# Altium footprint library Footprints.PcbLib: 266 footprints (part 1 of 17)
Each footprint in its own frame and in the unit in brackets; x right, y up, seen from the top. Pads: shape width x height; smd on the part's side, far side on the other; paste and mask are expansions set on the pad; w line width, h text height; cw(c..) or ccw(c..) is an arc to the next point about the centre after c.
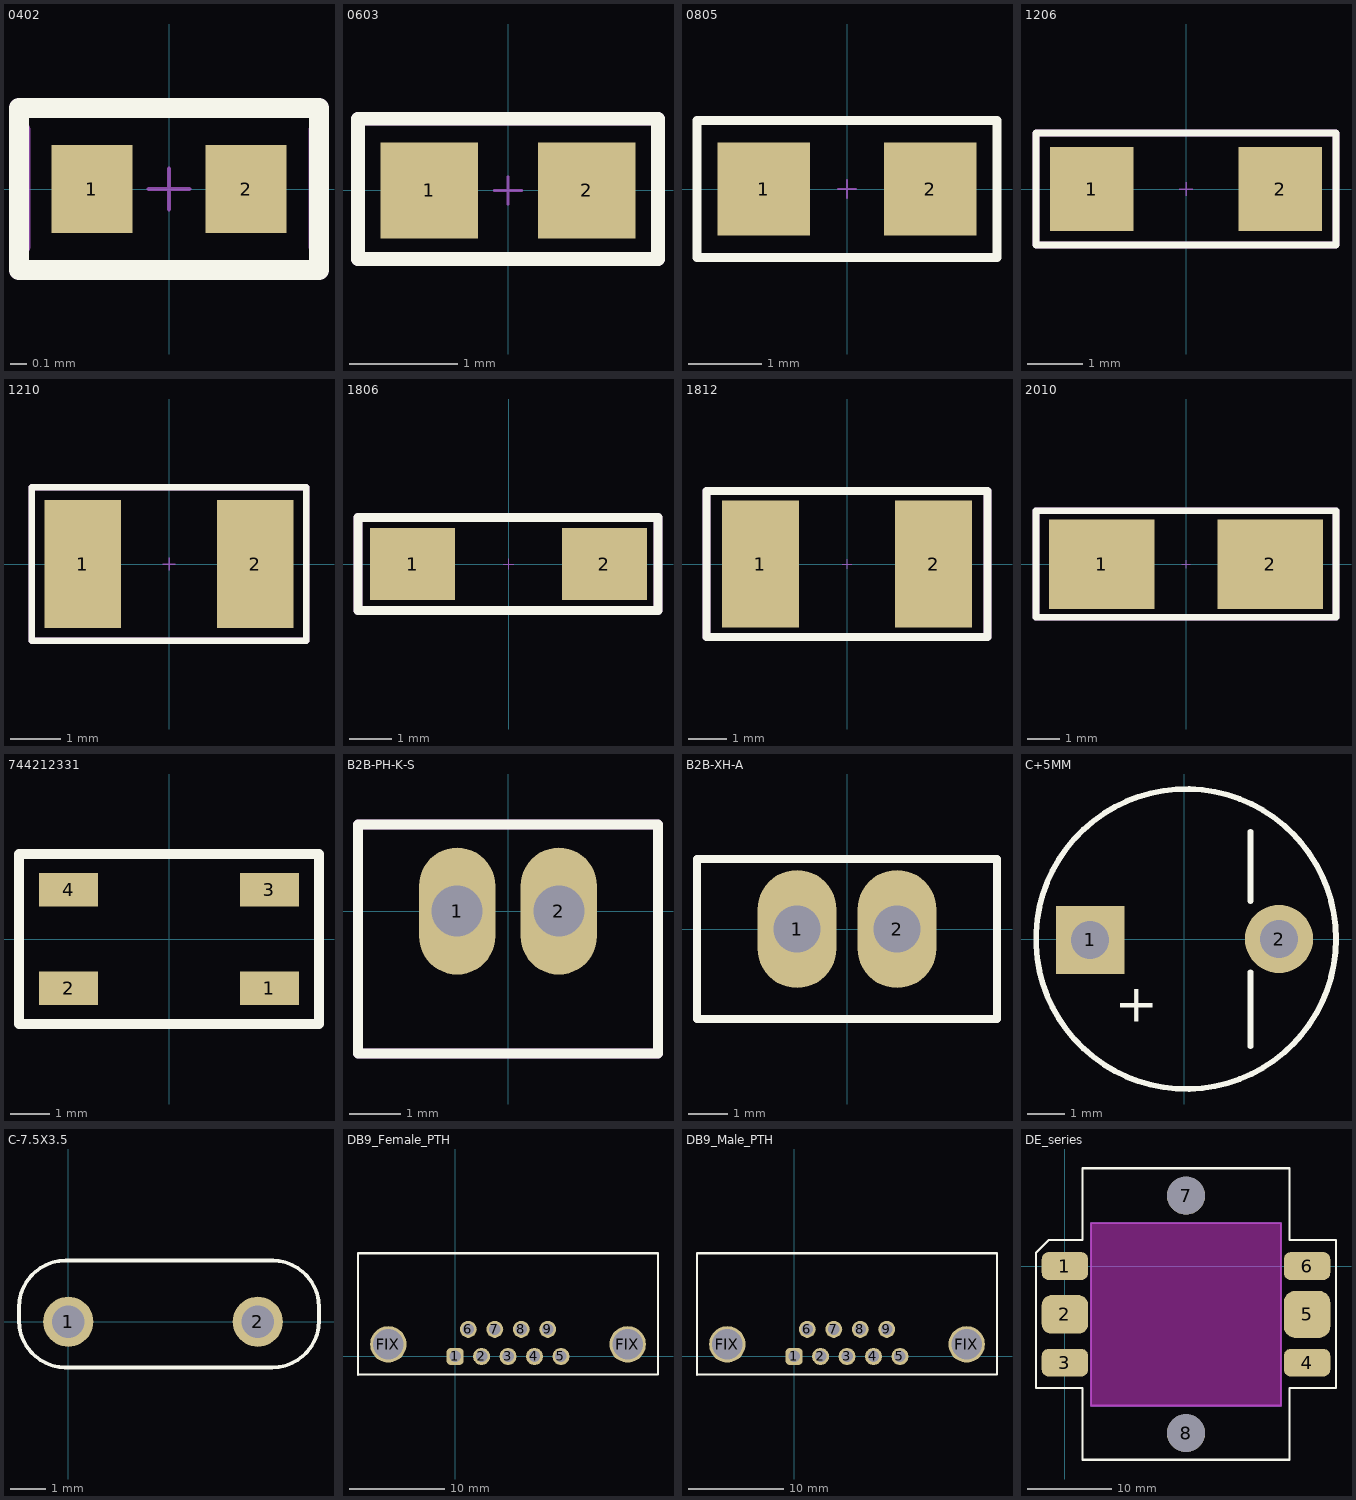
[diagram p0: the footprints below, top view; thin cyan lines are the x and y axes]

## 0402 [mil] "SMD 0402 inch - 1005 mm"
pads (2):
  rect 20x21.65 smd: 1(-19,0) 2(19,0)
Top Overlay:
  lines w5: -37,-20 -37,20 37,20 37,-20 -37,-20
Mechanical 15:
  lines w1: -5,0 0,0 5,0 ; 0,-5 0,5
  lines w5: -36.72,-14.17 -36.72,14.57 ; 36.91,-14.17 36.91,14.57 ; -37,-20 37,-20 37,20 -37,20 -37,-20
3D body "0402E.STEP": height 14.17, standoff -0.39, extent -20.08,-10 20.08,10.47

## 0603 [mm] "SMD 0603 inch - 1608 mm"
pads (2):
  rect 0.9x0.889 smd: 1(-0.726,0) 2(0.726,0)
Top Overlay:
  lines w0.127: -1.386,-0.635 -1.386,0.66 ; -1.367,-0.635 1.383,-0.635 ; -1.367,0.661 1.383,0.661 ; 1.385,-0.635 1.385,0.66
Mechanical 15:
  lines w0.025: -0.127,0 0,0 0.127,0 ; 0,-0.127 0,0.127
  lines w0.127: -1.386,-0.635 -1.386,0.66 ; -1.367,-0.635 1.383,-0.635 ; -1.367,0.661 1.383,0.661 ; 1.385,-0.635 1.385,0.66
3D body "0603E.STEP": height 0.48, standoff -0.03, extent -0.8,-0.43 0.8,0.43

## 0805 [mil] "SMD 0805 inch - 2012 mm"
pads (2):
  rect 50x50 smd: 1(-45,0) 2(45,0)
Top Overlay:
  lines w5: -81,-37 -81,37 ; -80,-37 81,-37 81,37 -80,37
Mechanical 15:
  lines w1: -5,0 0,0 5,0 ; 0,-5 0,5
3D body "0805E.STEP": height 16.93, standoff -1.18, extent -40,-25 38.74,24.61

## 1206 [mil] "SMD 1206 inch - 3216 mm"
pads (2):
  rect 60x60 smd: 1(-67.5,0) 2(67.5,0)
Top Overlay:
  lines w5: -107.5,-40 -107.5,40 107.5,40 107.5,-40 -107.5,-40
Mechanical 15:
  lines w1: -5,0 0,0 5,0 ; 0,-5 0,5
  lines w5: -107.5,-40 107.5,-40 107.5,40 -107.5,40 -107.5,-40
3D body "1206E.STEP": height 20.87, standoff -1.18, extent -62.5,-33 63.48,32.35

## 1210 [mil] "SMD 1210 inch - 3225 mm"
pads (2):
  rect 60x100 smd: 1(-67.5,0) 2(67.5,0)
Top Overlay:
  lines w5: -107.5,-60 -107.5,60 107.5,60 107.5,-60 -107.5,-60
Mechanical 15:
  lines w1: -5,0 0,0 5,0 ; 0,-5 0,5
  lines w5: -107.5,-60 107.5,-60 107.5,60 -107.5,60 -107.5,-60
3D body "1210E.STEP": height 24.02, standoff -0.39, extent -62.89,-50 63.89,49.21

## 1806 [mm] "SMD 1806 inch -  4516mm"
pads (2):
  rect 2x1.7 smd: 1(-2.25,0) 2(2.25,0)
Top Overlay:
  lines w0.203: -3.531,-1.092 3.505,-1.092 3.505,1.092 -3.531,1.092 -3.531,-1.092
Mechanical 15:
  lines w0.025: -0.127,0 0,0 0.127,0 ; 0,-0.127 0,0.127
  lines w0.203: -3.531,-1.092 -3.531,1.092 3.505,1.092 3.505,-1.092 -3.531,-1.092
3D body "1806.step": height 1.6, standoff 0, extent -2.239,-0.813 2.261,0.787

## 1812 [mm] "SMD 1812 inch -  4532mm"
pads (2):
  rect 2x3.302 smd: 1(-2.25,0) 2(2.25,0)
Top Overlay:
  lines w0.203: -3.653,-1.9 -3.653,1.9 3.653,1.9 3.653,-1.9 -3.653,-1.9
Mechanical 15:
  lines w0.025: -0.127,0 0,0 0.127,0 ; 0,-0.127 0,0.127
  lines w0.203: -3.653,-1.9 3.653,-1.9 3.653,1.9 -3.653,1.9 -3.653,-1.9
3D body "1812E.STEP": height 1.6, standoff 0, extent -2.25,-1.6 2.25,1.6

## 2010 [mil] "SMD 2010 inch - 5025 mm"
pads (2):
  rect 130x110 smd: 1(-103.5,0) 2(103.5,0)
Top Overlay:
  lines w8: -184.5,-65 184.5,-65 184.5,66 -184.5,66 -184.5,-65
Mechanical 15:
  lines w1: -5,0 0,0 5,0 ; 0,-5 0,5
  lines w8: -184.5,-65 -184.5,66 184.5,66 184.5,-65 -184.5,-65
3D body "2010E.STEP": height 24.02, standoff -0.39, extent -98.14,-50 99.5,49.21

## 744212331 [mm]
pads (4):
  rect 1.5x0.85 smd: 1(2.55,-1.25) 2(-2.55,-1.25) 3(2.55,1.25) 4(-2.55,1.25)
Top Overlay:
  lines w0.254: -3.81,-2.159 -3.81,2.159 3.81,2.159 3.81,-2.159 -3.81,-2.159
3D body "STEP-WE-SL1-rev1.stp": height 1.5, standoff -0.16, extent -2.6,-1.8 2.6,1.8

## B2B-PH-K-S [mm]
pads (2):
  oval 1.5x2.5 hole 1: 1(-1,0) 2(1,0)
Top Overlay:
  lines w0.2: -2.95,-2.8 -2.95,1.7 2.95,1.7 2.95,-2.8 -2.95,-2.8
Mechanical 13:
  lines w0.2: -2.95,-2.8 2.95,-2.8 2.95,1.7 -2.95,1.7 -2.95,-2.8
3D body "JST B2B-PH-K-S.STEP": height 6, standoff -3.4, extent -2.95,-2.8 2.95,1.7

## B2B-XH-A [mm]
pads (2):
  oval 2x3 hole 1.2: 1(-1.27,0) 2(1.27,0)
Top Overlay:
  lines w0.2: -3.81,-2.286 -3.81,1.778 3.81,1.778 3.81,-2.286 -3.81,-2.286
3D body "User Library-B2B-EH-A.step": height 6, standoff -3.2, extent -3.71,-2.154 3.79,1.646

## C+5MM [mil]
pads (2):
  rect 72x72 hole 40: 1(-99,-1)
  round 72 hole 40: 2(100,0)
Top Overlay:
  circle w6: c2,0 r158.05
  lines w6: 70,-113 70,-35 ; 70,40 70,113
  text "+" at -73,-87 h40

## C-7.5X3.5 [mm]
pads (2):
  round 1.4 hole 0.9: 1(0,0) 2(5.283,0)
Top Overlay:
  lines w0.102: -0.102,-1.275 5.69,-1.275 ; -0.076,1.706 5.715,1.706 ; -0.071,-1.275 cw(c-0.075,0.025) -1.375,0.025 -1.375,0.406 cw(c-0.075,0.406) -0.071,1.706 ; 5.685,-1.275 ccw(c5.688,0.025) 6.988,0.025 6.988,0.406 ccw(c5.688,0.406) 5.685,1.706
3D body "User Library-CAPML200 (2_5x6_6).step": height 9.14, standoff -3.77, extent -0.947,-1.173 6.129,1.427

## DB9_Female_PTH [mm] "DB9, Female, 90º, PTH"
height 12.6
pads (11):
  rrect50% 1.778x1.778 hole 1.2: 1(0,0)
  round 1.778 hole 1.2: 2(2.77,0) 3(5.54,0) 4(8.31,0) 5(11.08,0) 6(1.385,2.84) 7(4.155,2.84) 8(6.925,2.84) 9(9.695,2.84)
  round 3.81 hole 3.2: FIX(-6.985,1.27) FIX(18.059,1.27)
Top Overlay:
  lines w0.203: -10.16,-1.905 21.234,-1.905 21.234,10.795
  lines w0.254: -10.16,-1.905 -10.16,10.795 21.234,10.795
3D body "User Library-D-Sub-K122439102-Stig-Wahlstrom.STEP": height 12.45, standoff -3.85, extent -9.852,-2.291 20.958,16.909

## DB9_Male_PTH [mm] "DB9, Male, 90º, PTH"
height 12.6
pads (11):
  rrect50% 1.778x1.778 hole 1.2: 1(0,0)
  round 1.778 hole 1.2: 2(2.77,0) 3(5.54,0) 4(8.31,0) 5(11.08,0) 6(1.385,2.84) 7(4.155,2.84) 8(6.925,2.84) 9(9.695,2.84)
  round 3.81 hole 3.2: FIX(-6.985,1.27) FIX(18.059,1.27)
Top Overlay:
  lines w0.203: -10.16,-1.905 21.234,-1.905 21.234,10.795
  lines w0.254: -10.16,-1.905 -10.16,10.795 21.234,10.795
3D body "User Library-DBPN1M-09.step": height 12.65, standoff -4.72, extent -9.899,-2.08 20.821,17.094

## DE_series [mm]
height 2.67
pads (8):
  rrect50% 5.5x3.3 smd: 1(0,0) 3(0,-11.43) 4(28.65,-11.43) 6(28.65,0)
  rrect50% 5.5x4.57 smd: 2(0,-5.715)
  rrect50% 5.5x5.59 smd: 5(28.65,-5.715)
  round 4.5 hole 4.5 unplated: 7(14.33,8.335) 8(14.33,-19.765)
Top Overlay:
  lines w0.254: -3.425,-14.415 -3.425,1.585 -1.925,3.085 2.075,3.085 2.075,6.085 2.075,11.585 26.075,11.585 26.575,11.585 26.575,3.085 32.075,3.085 32.075,-14.415 26.575,-14.415 26.575,-22.915 2.075,-22.915 2.075,-14.415 -3.425,-14.415
Keep-Out Layer:
  board cut-out: 3.075,5.085 25.575,5.085 25.575,-16.515 3.075,-16.515
Mechanical 1:
  lines w0.254: 3.075,-16.515 3.075,5.085 25.585,5.085 25.585,-16.515 3.075,-16.515
3D body: height 1.67, standoff -1, extent 6,-13.5 22.5,2